# Altium schematic symbol library jlcpcb_2025_04_capacitors_extended_1206.schlib: 2503 symbols (part 7 of 14)
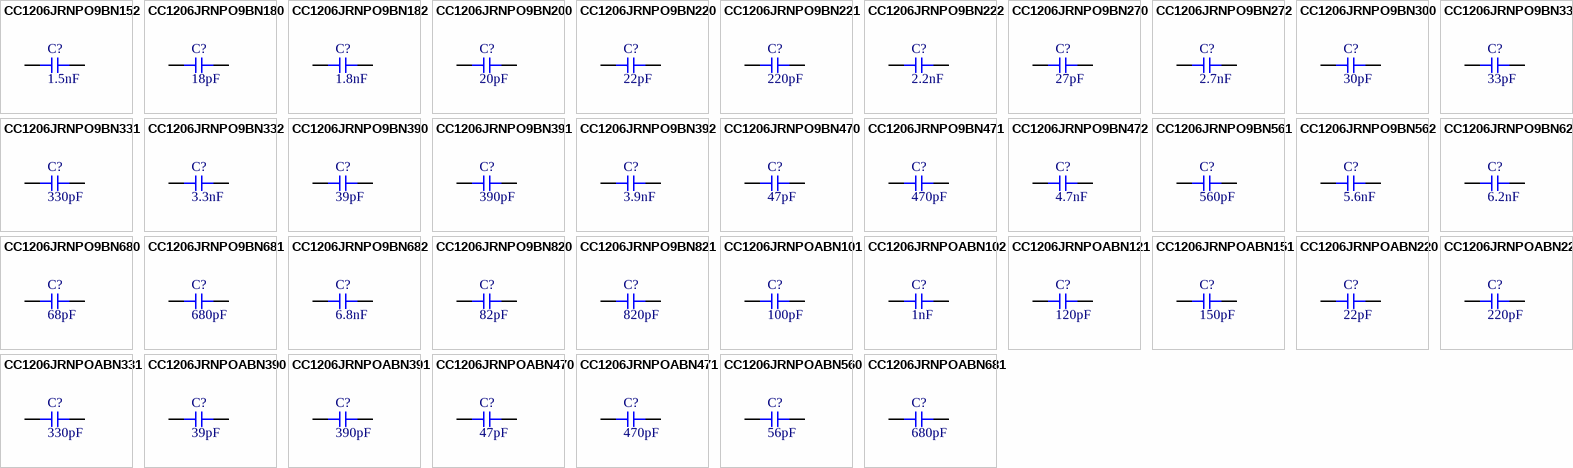
[diagram p68: symbols CC1206JRNPO9BN152 to CC1206JRNPOABN681]

## CC1206JRNPO9BN390
designator C?  Capacitance: 39pF  (hidden comment: *)
Capacitor, Ceramic (MLCC), 39pF, ±5%, 50V, NP0, ±5%, SMD 1206; Manufacturer: YAGEO; Manufacturer Part Number: CC1206JRNPO9BN390; Package Size: 1206; JLCPCB Basic Part: No; JLCPCB Part Number: C577164; Supplier 1: LCSC; Category: Capacitors - MLCC; Supplier Part Number 1: C577164; Tolerance: ±5%; Voltage Rating: 50V; Temperature Coefficient: NP0; RoHS: Yes; ComponentLink1Description: Datasheet; ComponentLink1URL: https://wmsc.lcsc.com/wmsc/upload/file/pdf/v2/lcsc/2009261808_YAGEO-CC1206JRNPO9BN390_C577164.pdf; ComponentLink2Description: JLCPCB Part URL; ComponentLink2URL: https://jlcpcb.com/partdetail/C577164; ComponentLink3Description: LCSC Part URL; ComponentLink3URL: https://lcsc.com/product-detail/Multilayer-Ceramic-Capacitors-MLCC---SMD-SMT_YAGEO-YAGEO-CC1206JRNPO9BN390_C577164.html
footprint CAP-1206 (1206 (3216M) Capacitor)
pins: 1, 2

## CC1206JRNPO9BN391
designator C?  Capacitance: 390pF  (hidden comment: *)
Capacitor, Ceramic (MLCC), 390pF, ±5%, 50V, NP0, ±5%, SMD 1206; Manufacturer: YAGEO; Manufacturer Part Number: CC1206JRNPO9BN391; Package Size: 1206; JLCPCB Basic Part: No; JLCPCB Part Number: C577165; Supplier 1: LCSC; Category: Capacitors - MLCC; Supplier Part Number 1: C577165; Tolerance: ±5%; Voltage Rating: 50V; Temperature Coefficient: NP0; RoHS: Yes; ComponentLink1Description: Datasheet; ComponentLink1URL: https://wmsc.lcsc.com/wmsc/upload/file/pdf/v2/lcsc/2009261808_YAGEO-CC1206JRNPO9BN391_C577165.pdf; ComponentLink2Description: JLCPCB Part URL; ComponentLink2URL: https://jlcpcb.com/partdetail/C577165; ComponentLink3Description: LCSC Part URL; ComponentLink3URL: https://lcsc.com/product-detail/Multilayer-Ceramic-Capacitors-MLCC---SMD-SMT_YAGEO-YAGEO-CC1206JRNPO9BN391_C577165.html
footprint CAP-1206 (1206 (3216M) Capacitor)
pins: 1, 2

## CC1206JRNPO9BN392
designator C?  Capacitance: 3.9nF  (hidden comment: *)
Capacitor, Ceramic (MLCC), 3.9nF, ±5%, 50V, NP0, ±5%, SMD 1206; Manufacturer: YAGEO; Manufacturer Part Number: CC1206JRNPO9BN392; Package Size: 1206; JLCPCB Basic Part: No; JLCPCB Part Number: C541503; Supplier 1: LCSC; Category: Capacitors - MLCC; Supplier Part Number 1: C541503; Tolerance: ±5%; Voltage Rating: 50V; Temperature Coefficient: NP0; RoHS: Yes; ComponentLink1Description: Datasheet; ComponentLink1URL: https://wmsc.lcsc.com/wmsc/upload/file/pdf/v2/lcsc/2006151141_YAGEO-CC1206JRNPO9BN392_C541503.pdf; ComponentLink2Description: JLCPCB Part URL; ComponentLink2URL: https://jlcpcb.com/partdetail/C541503; ComponentLink3Description: LCSC Part URL; ComponentLink3URL: https://lcsc.com/product-detail/Multilayer-Ceramic-Capacitors-MLCC---SMD-SMT_YAGEO-YAGEO-CC1206JRNPO9BN392_C541503.html
footprint CAP-1206 (1206 (3216M) Capacitor)
pins: 1, 2

## CC1206JRNPO9BN470
designator C?  Capacitance: 47pF  (hidden comment: *)
Capacitor, Ceramic (MLCC), 47pF, ±5%, 50V, NP0, ±5%, SMD 1206; Manufacturer: YAGEO; Manufacturer Part Number: CC1206JRNPO9BN470; Package Size: 1206; JLCPCB Basic Part: No; JLCPCB Part Number: C326961; Supplier 1: LCSC; Category: Capacitors - MLCC; Supplier Part Number 1: C326961; Tolerance: ±5%; Voltage Rating: 50V; Temperature Coefficient: NP0; RoHS: Yes; ComponentLink1Description: Datasheet; ComponentLink1URL: https://wmsc.lcsc.com/wmsc/upload/file/pdf/v2/lcsc/1811141241_YAGEO-CC1206JRNPO9BN470_C326961.pdf; ComponentLink2Description: JLCPCB Part URL; ComponentLink2URL: https://jlcpcb.com/partdetail/C326961; ComponentLink3Description: LCSC Part URL; ComponentLink3URL: https://lcsc.com/product-detail/Multilayer-Ceramic-Capacitors-MLCC---SMD-SMT_YAGEO-YAGEO-CC1206JRNPO9BN470_C326961.html
footprint CAP-1206 (1206 (3216M) Capacitor)
pins: 1, 2

## CC1206JRNPO9BN471
designator C?  Capacitance: 470pF  (hidden comment: *)
Capacitor, Ceramic (MLCC), 470pF, ±5%, 50V, NP0, ±5%, SMD 1206; Manufacturer: YAGEO; Manufacturer Part Number: CC1206JRNPO9BN471; Package Size: 1206; JLCPCB Basic Part: No; JLCPCB Part Number: C113885; Supplier 1: LCSC; Category: Capacitors - MLCC; Supplier Part Number 1: C113885; Tolerance: ±5%; Voltage Rating: 50V; Temperature Coefficient: NP0; RoHS: Yes; ComponentLink1Description: Datasheet; ComponentLink1URL: https://wmsc.lcsc.com/wmsc/upload/file/pdf/v2/lcsc/2304140030_YAGEO-CC1206JRNPO9BN471_C113885.pdf; ComponentLink2Description: JLCPCB Part URL; ComponentLink2URL: https://jlcpcb.com/partdetail/C113885; ComponentLink3Description: LCSC Part URL; ComponentLink3URL: https://lcsc.com/product-detail/Multilayer-Ceramic-Capacitors-MLCC---SMD-SMT_YAGEO-YAGEO-CC1206JRNPO9BN471_C113885.html
footprint CAP-1206 (1206 (3216M) Capacitor)
pins: 1, 2

## CC1206JRNPO9BN472
designator C?  Capacitance: 4.7nF  (hidden comment: *)
Capacitor, Ceramic (MLCC), 4.7nF, ±5%, 50V, NP0, ±5%, SMD 1206; Manufacturer: YAGEO; Manufacturer Part Number: CC1206JRNPO9BN472; Package Size: 1206; JLCPCB Basic Part: No; JLCPCB Part Number: C113886; Supplier 1: LCSC; Category: Capacitors - MLCC; Supplier Part Number 1: C113886; Tolerance: ±5%; Voltage Rating: 50V; Temperature Coefficient: NP0; RoHS: Yes; ComponentLink1Description: Datasheet; ComponentLink1URL: https://wmsc.lcsc.com/wmsc/upload/file/pdf/v2/lcsc/2304140030_YAGEO-CC1206JRNPO9BN472_C113886.pdf; ComponentLink2Description: JLCPCB Part URL; ComponentLink2URL: https://jlcpcb.com/partdetail/C113886; ComponentLink3Description: LCSC Part URL; ComponentLink3URL: https://lcsc.com/product-detail/Multilayer-Ceramic-Capacitors-MLCC---SMD-SMT_YAGEO-YAGEO-CC1206JRNPO9BN472_C113886.html
footprint CAP-1206 (1206 (3216M) Capacitor)
pins: 1, 2

## CC1206JRNPO9BN561
designator C?  Capacitance: 560pF  (hidden comment: *)
Capacitor, Ceramic (MLCC), 560pF, ±5%, 50V, NP0, ±5%, SMD 1206; Manufacturer: YAGEO; Manufacturer Part Number: CC1206JRNPO9BN561; Package Size: 1206; JLCPCB Basic Part: No; JLCPCB Part Number: C577166; Supplier 1: LCSC; Category: Capacitors - MLCC; Supplier Part Number 1: C577166; Tolerance: ±5%; Voltage Rating: 50V; Temperature Coefficient: NP0; RoHS: Yes; ComponentLink1Description: Datasheet; ComponentLink1URL: https://wmsc.lcsc.com/wmsc/upload/file/pdf/v2/lcsc/2009261809_YAGEO-CC1206JRNPO9BN561_C577166.pdf; ComponentLink2Description: JLCPCB Part URL; ComponentLink2URL: https://jlcpcb.com/partdetail/C577166; ComponentLink3Description: LCSC Part URL; ComponentLink3URL: https://lcsc.com/product-detail/Multilayer-Ceramic-Capacitors-MLCC---SMD-SMT_YAGEO-YAGEO-CC1206JRNPO9BN561_C577166.html
footprint CAP-1206 (1206 (3216M) Capacitor)
pins: 1, 2

## CC1206JRNPO9BN562
designator C?  Capacitance: 5.6nF  (hidden comment: *)
Capacitor, Ceramic (MLCC), 5.6nF, ±5%, 50V, NP0, ±5%, SMD 1206; Manufacturer: YAGEO; Manufacturer Part Number: CC1206JRNPO9BN562; Package Size: 1206; JLCPCB Basic Part: No; JLCPCB Part Number: C527296; Supplier 1: LCSC; Category: Capacitors - MLCC; Supplier Part Number 1: C527296; Tolerance: ±5%; Voltage Rating: 50V; Temperature Coefficient: NP0; RoHS: Yes; ComponentLink1Description: Datasheet; ComponentLink1URL: https://wmsc.lcsc.com/wmsc/upload/file/pdf/v2/lcsc/2008061533_YAGEO-CC1206JRNPO9BN562_C527296.pdf; ComponentLink2Description: JLCPCB Part URL; ComponentLink2URL: https://jlcpcb.com/partdetail/C527296; ComponentLink3Description: LCSC Part URL; ComponentLink3URL: https://lcsc.com/product-detail/Multilayer-Ceramic-Capacitors-MLCC---SMD-SMT_YAGEO-YAGEO-CC1206JRNPO9BN562_C527296.html
footprint CAP-1206 (1206 (3216M) Capacitor)
pins: 1, 2

## CC1206JRNPO9BN622
designator C?  Capacitance: 6.2nF  (hidden comment: *)
Capacitor, Ceramic (MLCC), 6.2nF, ±5%, null, NP0, ±5%, SMD 1206; Manufacturer: YAGEO; Manufacturer Part Number: CC1206JRNPO9BN622; Package Size: 1206; JLCPCB Basic Part: No; JLCPCB Part Number: C577167; Supplier 1: LCSC; Category: Capacitors - MLCC; Supplier Part Number 1: C577167; Tolerance: ±5%; Voltage Rating: null; Temperature Coefficient: NP0; RoHS: Yes; ComponentLink1Description: Datasheet; ComponentLink1URL: https://wmsc.lcsc.com/wmsc/upload/file/pdf/v2/lcsc/2212291709_YAGEO-CC1206JRNPO9BN622_C577167.pdf; ComponentLink2Description: JLCPCB Part URL; ComponentLink2URL: https://jlcpcb.com/partdetail/C577167; ComponentLink3Description: LCSC Part URL; ComponentLink3URL: https://lcsc.com/product-detail/Multilayer-Ceramic-Capacitors-MLCC---SMD-SMT_YAGEO-YAGEO-CC1206JRNPO9BN622_C577167.html
footprint CAP-1206 (1206 (3216M) Capacitor)
pins: 1, 2

## CC1206JRNPO9BN680
designator C?  Capacitance: 68pF  (hidden comment: *)
Capacitor, Ceramic (MLCC), 68pF, ±5%, 50V, NP0, ±5%, SMD 1206; Manufacturer: YAGEO; Manufacturer Part Number: CC1206JRNPO9BN680; Package Size: 1206; JLCPCB Basic Part: No; JLCPCB Part Number: C327056; Supplier 1: LCSC; Category: Capacitors - MLCC; Supplier Part Number 1: C327056; Tolerance: ±5%; Voltage Rating: 50V; Temperature Coefficient: NP0; RoHS: Yes; ComponentLink1Description: Datasheet; ComponentLink1URL: https://wmsc.lcsc.com/wmsc/upload/file/pdf/v2/lcsc/1811141233_YAGEO-CC1206JRNPO9BN680_C327056.pdf; ComponentLink2Description: JLCPCB Part URL; ComponentLink2URL: https://jlcpcb.com/partdetail/C327056; ComponentLink3Description: LCSC Part URL; ComponentLink3URL: https://lcsc.com/product-detail/Multilayer-Ceramic-Capacitors-MLCC---SMD-SMT_YAGEO-YAGEO-CC1206JRNPO9BN680_C327056.html
footprint CAP-1206 (1206 (3216M) Capacitor)
pins: 1, 2

## CC1206JRNPO9BN681
designator C?  Capacitance: 680pF  (hidden comment: *)
Capacitor, Ceramic (MLCC), 680pF, ±5%, 50V, NP0, ±5%, SMD 1206; Manufacturer: YAGEO; Manufacturer Part Number: CC1206JRNPO9BN681; Package Size: 1206; JLCPCB Basic Part: No; JLCPCB Part Number: C541478; Supplier 1: LCSC; Category: Capacitors - MLCC; Supplier Part Number 1: C541478; Tolerance: ±5%; Voltage Rating: 50V; Temperature Coefficient: NP0; RoHS: Yes; ComponentLink1Description: Datasheet; ComponentLink1URL: https://wmsc.lcsc.com/wmsc/upload/file/pdf/v2/lcsc/2006151139_YAGEO-CC1206JRNPO9BN681_C541478.pdf; ComponentLink2Description: JLCPCB Part URL; ComponentLink2URL: https://jlcpcb.com/partdetail/C541478; ComponentLink3Description: LCSC Part URL; ComponentLink3URL: https://lcsc.com/product-detail/Multilayer-Ceramic-Capacitors-MLCC---SMD-SMT_YAGEO-YAGEO-CC1206JRNPO9BN681_C541478.html
footprint CAP-1206 (1206 (3216M) Capacitor)
pins: 1, 2

## CC1206JRNPO9BN682
designator C?  Capacitance: 6.8nF  (hidden comment: *)
Capacitor, Ceramic (MLCC), 6.8nF, ±5%, 50V, NP0, ±5%, SMD 1206; Manufacturer: YAGEO; Manufacturer Part Number: CC1206JRNPO9BN682; Package Size: 1206; JLCPCB Basic Part: No; JLCPCB Part Number: C326672; Supplier 1: LCSC; Category: Capacitors - MLCC; Supplier Part Number 1: C326672; Tolerance: ±5%; Voltage Rating: 50V; Temperature Coefficient: NP0; RoHS: Yes; ComponentLink1Description: Datasheet; ComponentLink1URL: https://wmsc.lcsc.com/wmsc/upload/file/pdf/v2/lcsc/1811151646_YAGEO-CC1206JRNPO9BN682_C326672.pdf; ComponentLink2Description: JLCPCB Part URL; ComponentLink2URL: https://jlcpcb.com/partdetail/C326672; ComponentLink3Description: LCSC Part URL; ComponentLink3URL: https://lcsc.com/product-detail/Multilayer-Ceramic-Capacitors-MLCC---SMD-SMT_YAGEO-YAGEO-CC1206JRNPO9BN682_C326672.html
footprint CAP-1206 (1206 (3216M) Capacitor)
pins: 1, 2

## CC1206JRNPO9BN820
designator C?  Capacitance: 82pF  (hidden comment: *)
Capacitor, Ceramic (MLCC), 82pF, ±5%, null, NP0, ±5%, SMD 1206; Manufacturer: YAGEO; Manufacturer Part Number: CC1206JRNPO9BN820; Package Size: 1206; JLCPCB Basic Part: No; JLCPCB Part Number: C577169; Supplier 1: LCSC; Category: Capacitors - MLCC; Supplier Part Number 1: C577169; Tolerance: ±5%; Voltage Rating: null; Temperature Coefficient: NP0; RoHS: Yes; ComponentLink1Description: Datasheet; ComponentLink1URL: https://wmsc.lcsc.com/wmsc/upload/file/pdf/v2/lcsc/2211211800_YAGEO-CC1206JRNPO9BN820_C577169.pdf; ComponentLink2Description: JLCPCB Part URL; ComponentLink2URL: https://jlcpcb.com/partdetail/C577169; ComponentLink3Description: LCSC Part URL; ComponentLink3URL: https://lcsc.com/product-detail/Multilayer-Ceramic-Capacitors-MLCC---SMD-SMT_YAGEO-YAGEO-CC1206JRNPO9BN820_C577169.html
footprint CAP-1206 (1206 (3216M) Capacitor)
pins: 1, 2

## CC1206JRNPO9BN821
designator C?  Capacitance: 820pF  (hidden comment: *)
Capacitor, Ceramic (MLCC), 820pF, ±5%, 50V, NP0, ±5%, SMD 1206; Manufacturer: YAGEO; Manufacturer Part Number: CC1206JRNPO9BN821; Package Size: 1206; JLCPCB Basic Part: No; JLCPCB Part Number: C577170; Supplier 1: LCSC; Category: Capacitors - MLCC; Supplier Part Number 1: C577170; Tolerance: ±5%; Voltage Rating: 50V; Temperature Coefficient: NP0; RoHS: Yes; ComponentLink1Description: Datasheet; ComponentLink1URL: https://wmsc.lcsc.com/wmsc/upload/file/pdf/v2/lcsc/2009261809_YAGEO-CC1206JRNPO9BN821_C577170.pdf; ComponentLink2Description: JLCPCB Part URL; ComponentLink2URL: https://jlcpcb.com/partdetail/C577170; ComponentLink3Description: LCSC Part URL; ComponentLink3URL: https://lcsc.com/product-detail/Multilayer-Ceramic-Capacitors-MLCC---SMD-SMT_YAGEO-YAGEO-CC1206JRNPO9BN821_C577170.html
footprint CAP-1206 (1206 (3216M) Capacitor)
pins: 1, 2

## CC1206JRNPOABN101
designator C?  Capacitance: 100pF  (hidden comment: *)
Capacitor, Ceramic (MLCC), 100pF, ±5%, 200V, NP0, ±5%, SMD 1206; Manufacturer: YAGEO; Manufacturer Part Number: CC1206JRNPOABN101; Package Size: 1206; JLCPCB Basic Part: No; JLCPCB Part Number: C577171; Supplier 1: LCSC; Category: Capacitors - MLCC; Supplier Part Number 1: C577171; Tolerance: ±5%; Voltage Rating: 200V; Temperature Coefficient: NP0; RoHS: Yes; ComponentLink1Description: Datasheet; ComponentLink1URL: https://wmsc.lcsc.com/wmsc/upload/file/pdf/v2/lcsc/2204121100_YAGEO-CC1206JRNPOABN101_C577171.pdf; ComponentLink2Description: JLCPCB Part URL; ComponentLink2URL: https://jlcpcb.com/partdetail/C577171; ComponentLink3Description: LCSC Part URL; ComponentLink3URL: https://lcsc.com/product-detail/Multilayer-Ceramic-Capacitors-MLCC---SMD-SMT_YAGEO-YAGEO-CC1206JRNPOABN101_C577171.html
footprint CAP-1206 (1206 (3216M) Capacitor)
pins: 1, 2

## CC1206JRNPOABN102
designator C?  Capacitance: 1nF  (hidden comment: *)
Capacitor, Ceramic (MLCC), 1nF, ±5%, 200V, NP0, ±5%, SMD 1206; Manufacturer: YAGEO; Manufacturer Part Number: CC1206JRNPOABN102; Package Size: 1206; JLCPCB Basic Part: No; JLCPCB Part Number: C326762; Supplier 1: LCSC; Category: Capacitors - MLCC; Supplier Part Number 1: C326762; Tolerance: ±5%; Voltage Rating: 200V; Temperature Coefficient: NP0; RoHS: Yes; ComponentLink1Description: Datasheet; ComponentLink1URL: https://wmsc.lcsc.com/wmsc/upload/file/pdf/v2/lcsc/2311211121_YAGEO-CC1206JRNPOABN102_C326762.pdf; ComponentLink2Description: JLCPCB Part URL; ComponentLink2URL: https://jlcpcb.com/partdetail/C326762; ComponentLink3Description: LCSC Part URL; ComponentLink3URL: https://lcsc.com/product-detail/Multilayer-Ceramic-Capacitors-MLCC---SMD-SMT_YAGEO-YAGEO-CC1206JRNPOABN102_C326762.html
footprint CAP-1206 (1206 (3216M) Capacitor)
pins: 1, 2

## CC1206JRNPOABN121
designator C?  Capacitance: 120pF  (hidden comment: *)
Capacitor, Ceramic (MLCC), 120pF, ±5%, 200V, NP0, ±5%, SMD 1206; Manufacturer: YAGEO; Manufacturer Part Number: CC1206JRNPOABN121; Package Size: 1206; JLCPCB Basic Part: No; JLCPCB Part Number: C113887; Supplier 1: LCSC; Category: Capacitors - MLCC; Supplier Part Number 1: C113887; Tolerance: ±5%; Voltage Rating: 200V; Temperature Coefficient: NP0; RoHS: Yes; ComponentLink1Description: Datasheet; ComponentLink1URL: https://wmsc.lcsc.com/wmsc/upload/file/pdf/v2/lcsc/2304140030_YAGEO-CC1206JRNPOABN121_C113887.pdf; ComponentLink2Description: JLCPCB Part URL; ComponentLink2URL: https://jlcpcb.com/partdetail/C113887; ComponentLink3Description: LCSC Part URL; ComponentLink3URL: https://lcsc.com/product-detail/Multilayer-Ceramic-Capacitors-MLCC---SMD-SMT_YAGEO-YAGEO-CC1206JRNPOABN121_C113887.html
footprint CAP-1206 (1206 (3216M) Capacitor)
pins: 1, 2

## CC1206JRNPOABN151
designator C?  Capacitance: 150pF  (hidden comment: *)
Capacitor, Ceramic (MLCC), 150pF, ±5%, 200V, NP0, ±5%, SMD 1206; Manufacturer: YAGEO; Manufacturer Part Number: CC1206JRNPOABN151; Package Size: 1206; JLCPCB Basic Part: No; JLCPCB Part Number: C326651; Supplier 1: LCSC; Category: Capacitors - MLCC; Supplier Part Number 1: C326651; Tolerance: ±5%; Voltage Rating: 200V; Temperature Coefficient: NP0; RoHS: Yes; ComponentLink1Description: Datasheet; ComponentLink1URL: https://wmsc.lcsc.com/wmsc/upload/file/pdf/v2/lcsc/1811141232_YAGEO-CC1206JRNPOABN151_C326651.pdf; ComponentLink2Description: JLCPCB Part URL; ComponentLink2URL: https://jlcpcb.com/partdetail/C326651; ComponentLink3Description: LCSC Part URL; ComponentLink3URL: https://lcsc.com/product-detail/Multilayer-Ceramic-Capacitors-MLCC---SMD-SMT_YAGEO-YAGEO-CC1206JRNPOABN151_C326651.html
footprint CAP-1206 (1206 (3216M) Capacitor)
pins: 1, 2

## CC1206JRNPOABN220
designator C?  Capacitance: 22pF  (hidden comment: *)
Capacitor, Ceramic (MLCC), 22pF, ±5%, 200V, NP0, ±5%, SMD 1206; Manufacturer: YAGEO; Manufacturer Part Number: CC1206JRNPOABN220; Package Size: 1206; JLCPCB Basic Part: No; JLCPCB Part Number: C527297; Supplier 1: LCSC; Category: Capacitors - MLCC; Supplier Part Number 1: C527297; Tolerance: ±5%; Voltage Rating: 200V; Temperature Coefficient: NP0; RoHS: Yes; ComponentLink1Description: Datasheet; ComponentLink1URL: https://wmsc.lcsc.com/wmsc/upload/file/pdf/v2/lcsc/2006181535_YAGEO-CC1206JRNPOABN220_C527297.pdf; ComponentLink2Description: JLCPCB Part URL; ComponentLink2URL: https://jlcpcb.com/partdetail/C527297; ComponentLink3Description: LCSC Part URL; ComponentLink3URL: https://lcsc.com/product-detail/Multilayer-Ceramic-Capacitors-MLCC---SMD-SMT_YAGEO-YAGEO-CC1206JRNPOABN220_C527297.html
footprint CAP-1206 (1206 (3216M) Capacitor)
pins: 1, 2

## CC1206JRNPOABN221
designator C?  Capacitance: 220pF  (hidden comment: *)
Capacitor, Ceramic (MLCC), 220pF, ±5%, 200V, NP0, ±5%, SMD 1206; Manufacturer: YAGEO; Manufacturer Part Number: CC1206JRNPOABN221; Package Size: 1206; JLCPCB Basic Part: No; JLCPCB Part Number: C527298; Supplier 1: LCSC; Category: Capacitors - MLCC; Supplier Part Number 1: C527298; Tolerance: ±5%; Voltage Rating: 200V; Temperature Coefficient: NP0; RoHS: Yes; ComponentLink1Description: Datasheet; ComponentLink1URL: https://wmsc.lcsc.com/wmsc/upload/file/pdf/v2/lcsc/2007221234_YAGEO-CC1206JRNPOABN221_C527298.pdf; ComponentLink2Description: JLCPCB Part URL; ComponentLink2URL: https://jlcpcb.com/partdetail/C527298; ComponentLink3Description: LCSC Part URL; ComponentLink3URL: https://lcsc.com/product-detail/Multilayer-Ceramic-Capacitors-MLCC---SMD-SMT_YAGEO-YAGEO-CC1206JRNPOABN221_C527298.html
footprint CAP-1206 (1206 (3216M) Capacitor)
pins: 1, 2

## CC1206JRNPOABN331
designator C?  Capacitance: 330pF  (hidden comment: *)
Capacitor, Ceramic (MLCC), 330pF, ±5%, 200V, NP0, ±5%, SMD 1206; Manufacturer: YAGEO; Manufacturer Part Number: CC1206JRNPOABN331; Package Size: 1206; JLCPCB Basic Part: No; JLCPCB Part Number: C527299; Supplier 1: LCSC; Category: Capacitors - MLCC; Supplier Part Number 1: C527299; Tolerance: ±5%; Voltage Rating: 200V; Temperature Coefficient: NP0; RoHS: Yes; ComponentLink1Description: Datasheet; ComponentLink1URL: https://wmsc.lcsc.com/wmsc/upload/file/pdf/v2/lcsc/2006031836_YAGEO-CC1206JRNPOABN331_C527299.pdf; ComponentLink2Description: JLCPCB Part URL; ComponentLink2URL: https://jlcpcb.com/partdetail/C527299; ComponentLink3Description: LCSC Part URL; ComponentLink3URL: https://lcsc.com/product-detail/Multilayer-Ceramic-Capacitors-MLCC---SMD-SMT_YAGEO-YAGEO-CC1206JRNPOABN331_C527299.html
footprint CAP-1206 (1206 (3216M) Capacitor)
pins: 1, 2

## CC1206JRNPOABN390
designator C?  Capacitance: 39pF  (hidden comment: *)
Capacitor, Ceramic (MLCC), 39pF, ±5%, 200V, NP0, ±5%, SMD 1206; Manufacturer: YAGEO; Manufacturer Part Number: CC1206JRNPOABN390; Package Size: 1206; JLCPCB Basic Part: No; JLCPCB Part Number: C577176; Supplier 1: LCSC; Category: Capacitors - MLCC; Supplier Part Number 1: C577176; Tolerance: ±5%; Voltage Rating: 200V; Temperature Coefficient: NP0; RoHS: Yes; ComponentLink1Description: Datasheet; ComponentLink1URL: https://wmsc.lcsc.com/wmsc/upload/file/pdf/v2/lcsc/2311211121_YAGEO-CC1206JRNPOABN390_C577176.pdf; ComponentLink2Description: JLCPCB Part URL; ComponentLink2URL: https://jlcpcb.com/partdetail/C577176; ComponentLink3Description: LCSC Part URL; ComponentLink3URL: https://lcsc.com/product-detail/Multilayer-Ceramic-Capacitors-MLCC---SMD-SMT_YAGEO-YAGEO-CC1206JRNPOABN390_C577176.html
footprint CAP-1206 (1206 (3216M) Capacitor)
pins: 1, 2

## CC1206JRNPOABN391
designator C?  Capacitance: 390pF  (hidden comment: *)
Capacitor, Ceramic (MLCC), 390pF, ±5%, 200V, NP0, ±5%, SMD 1206; Manufacturer: YAGEO; Manufacturer Part Number: CC1206JRNPOABN391; Package Size: 1206; JLCPCB Basic Part: No; JLCPCB Part Number: C527300; Supplier 1: LCSC; Category: Capacitors - MLCC; Supplier Part Number 1: C527300; Tolerance: ±5%; Voltage Rating: 200V; Temperature Coefficient: NP0; RoHS: Yes; ComponentLink1Description: Datasheet; ComponentLink1URL: https://wmsc.lcsc.com/wmsc/upload/file/pdf/v2/lcsc/2007021837_YAGEO-CC1206JRNPOABN391_C527300.pdf; ComponentLink2Description: JLCPCB Part URL; ComponentLink2URL: https://jlcpcb.com/partdetail/C527300; ComponentLink3Description: LCSC Part URL; ComponentLink3URL: https://lcsc.com/product-detail/Multilayer-Ceramic-Capacitors-MLCC---SMD-SMT_YAGEO-YAGEO-CC1206JRNPOABN391_C527300.html
footprint CAP-1206 (1206 (3216M) Capacitor)
pins: 1, 2

## CC1206JRNPOABN470
designator C?  Capacitance: 47pF  (hidden comment: *)
Capacitor, Ceramic (MLCC), 47pF, ±5%, 200V, NP0, ±5%, SMD 1206; Manufacturer: YAGEO; Manufacturer Part Number: CC1206JRNPOABN470; Package Size: 1206; JLCPCB Basic Part: No; JLCPCB Part Number: C527301; Supplier 1: LCSC; Category: Capacitors - MLCC; Supplier Part Number 1: C527301; Tolerance: ±5%; Voltage Rating: 200V; Temperature Coefficient: NP0; RoHS: Yes; ComponentLink1Description: Datasheet; ComponentLink1URL: https://wmsc.lcsc.com/wmsc/upload/file/pdf/v2/lcsc/2006101835_YAGEO-CC1206JRNPOABN470_C527301.pdf; ComponentLink2Description: JLCPCB Part URL; ComponentLink2URL: https://jlcpcb.com/partdetail/C527301; ComponentLink3Description: LCSC Part URL; ComponentLink3URL: https://lcsc.com/product-detail/Multilayer-Ceramic-Capacitors-MLCC---SMD-SMT_YAGEO-YAGEO-CC1206JRNPOABN470_C527301.html
footprint CAP-1206 (1206 (3216M) Capacitor)
pins: 1, 2

## CC1206JRNPOABN471
designator C?  Capacitance: 470pF  (hidden comment: *)
Capacitor, Ceramic (MLCC), 470pF, ±5%, 200V, NP0, ±5%, SMD 1206; Manufacturer: YAGEO; Manufacturer Part Number: CC1206JRNPOABN471; Package Size: 1206; JLCPCB Basic Part: No; JLCPCB Part Number: C527302; Supplier 1: LCSC; Category: Capacitors - MLCC; Supplier Part Number 1: C527302; Tolerance: ±5%; Voltage Rating: 200V; Temperature Coefficient: NP0; RoHS: Yes; ComponentLink1Description: Datasheet; ComponentLink1URL: https://wmsc.lcsc.com/wmsc/upload/file/pdf/v2/lcsc/2006101835_YAGEO-CC1206JRNPOABN471_C527302.pdf; ComponentLink2Description: JLCPCB Part URL; ComponentLink2URL: https://jlcpcb.com/partdetail/C527302; ComponentLink3Description: LCSC Part URL; ComponentLink3URL: https://lcsc.com/product-detail/Multilayer-Ceramic-Capacitors-MLCC---SMD-SMT_YAGEO-YAGEO-CC1206JRNPOABN471_C527302.html
footprint CAP-1206 (1206 (3216M) Capacitor)
pins: 1, 2

## CC1206JRNPOABN560
designator C?  Capacitance: 56pF  (hidden comment: *)
Capacitor, Ceramic (MLCC), 56pF, ±5%, 200V, NP0, ±5%, SMD 1206; Manufacturer: YAGEO; Manufacturer Part Number: CC1206JRNPOABN560; Package Size: 1206; JLCPCB Basic Part: No; JLCPCB Part Number: C527303; Supplier 1: LCSC; Category: Capacitors - MLCC; Supplier Part Number 1: C527303; Tolerance: ±5%; Voltage Rating: 200V; Temperature Coefficient: NP0; RoHS: Yes; ComponentLink1Description: Datasheet; ComponentLink1URL: https://wmsc.lcsc.com/wmsc/upload/file/pdf/v2/lcsc/2007171236_YAGEO-CC1206JRNPOABN560_C527303.pdf; ComponentLink2Description: JLCPCB Part URL; ComponentLink2URL: https://jlcpcb.com/partdetail/C527303; ComponentLink3Description: LCSC Part URL; ComponentLink3URL: https://lcsc.com/product-detail/Multilayer-Ceramic-Capacitors-MLCC---SMD-SMT_YAGEO-YAGEO-CC1206JRNPOABN560_C527303.html
footprint CAP-1206 (1206 (3216M) Capacitor)
pins: 1, 2

## CC1206JRNPOABN681
designator C?  Capacitance: 680pF  (hidden comment: *)
Capacitor, Ceramic (MLCC), 680pF, ±5%, 200V, NP0, ±5%, SMD 1206; Manufacturer: YAGEO; Manufacturer Part Number: CC1206JRNPOABN681; Package Size: 1206; JLCPCB Basic Part: No; JLCPCB Part Number: C527304; Supplier 1: LCSC; Category: Capacitors - MLCC; Supplier Part Number 1: C527304; Tolerance: ±5%; Voltage Rating: 200V; Temperature Coefficient: NP0; RoHS: Yes; ComponentLink1Description: Datasheet; ComponentLink1URL: https://wmsc.lcsc.com/wmsc/upload/file/pdf/v2/lcsc/2006101835_YAGEO-CC1206JRNPOABN681_C527304.pdf; ComponentLink2Description: JLCPCB Part URL; ComponentLink2URL: https://jlcpcb.com/partdetail/C527304; ComponentLink3Description: LCSC Part URL; ComponentLink3URL: https://lcsc.com/product-detail/Multilayer-Ceramic-Capacitors-MLCC---SMD-SMT_YAGEO-YAGEO-CC1206JRNPOABN681_C527304.html
footprint CAP-1206 (1206 (3216M) Capacitor)
pins: 1, 2

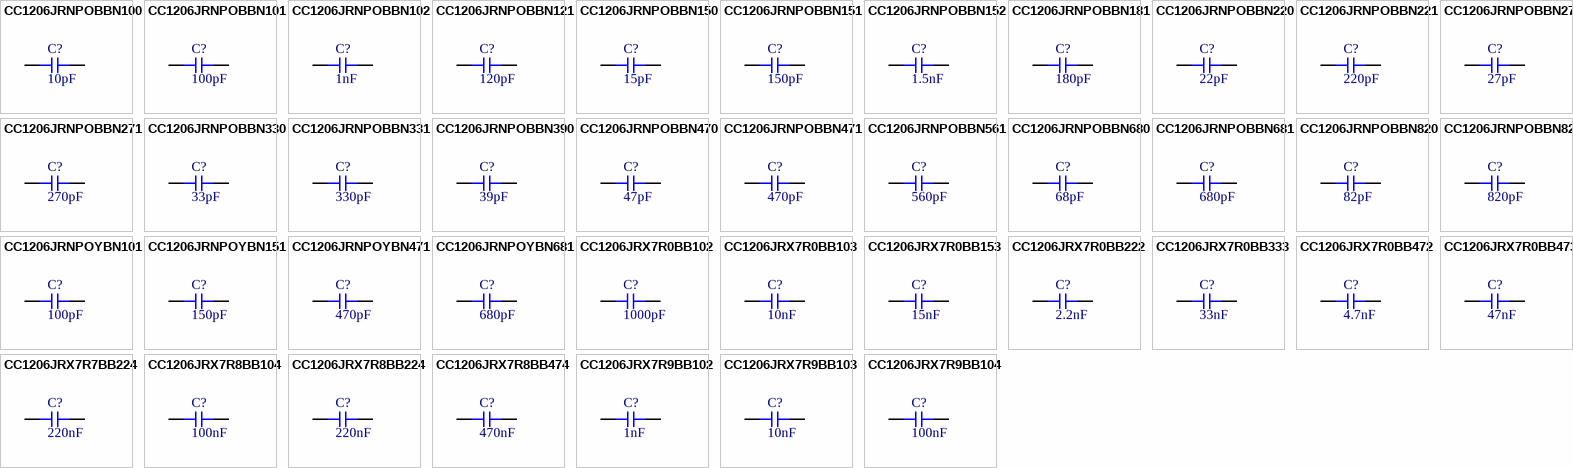
[diagram p28: symbols CC1206JRNPOBBN100 to CC1206JRX7R9BB104]

## CC1206JRNPOBBN100
designator C?  Capacitance: 10pF  (hidden comment: *)
Capacitor, Ceramic (MLCC), 10pF, ±5%, 500V, NP0, ±5%, SMD 1206; Manufacturer: YAGEO; Manufacturer Part Number: CC1206JRNPOBBN100; Package Size: 1206; JLCPCB Basic Part: No; JLCPCB Part Number: C469628; Supplier 1: LCSC; Category: Capacitors - MLCC; Supplier Part Number 1: C469628; Tolerance: ±5%; Voltage Rating: 500V; Temperature Coefficient: NP0; RoHS: Yes; ComponentLink1Description: Datasheet; ComponentLink1URL: https://wmsc.lcsc.com/wmsc/upload/file/pdf/v2/lcsc/2311211121_YAGEO-CC1206JRNPOBBN100_C469628.pdf; ComponentLink2Description: JLCPCB Part URL; ComponentLink2URL: https://jlcpcb.com/partdetail/C469628; ComponentLink3Description: LCSC Part URL; ComponentLink3URL: https://lcsc.com/product-detail/Multilayer-Ceramic-Capacitors-MLCC---SMD-SMT_YAGEO-YAGEO-CC1206JRNPOBBN100_C469628.html
footprint CAP-1206 (1206 (3216M) Capacitor)
pins: 1, 2

## CC1206JRNPOBBN101
designator C?  Capacitance: 100pF  (hidden comment: *)
Capacitor, Ceramic (MLCC), 100pF, ±5%, 500V, NP0, ±5%, SMD 1206; Manufacturer: YAGEO; Manufacturer Part Number: CC1206JRNPOBBN101; Package Size: 1206; JLCPCB Basic Part: No; JLCPCB Part Number: C113888; Supplier 1: LCSC; Category: Capacitors - MLCC; Supplier Part Number 1: C113888; Tolerance: ±5%; Voltage Rating: 500V; Temperature Coefficient: NP0; RoHS: Yes; ComponentLink1Description: Datasheet; ComponentLink1URL: https://wmsc.lcsc.com/wmsc/upload/file/pdf/v2/lcsc/2304140030_YAGEO-CC1206JRNPOBBN101_C113888.pdf; ComponentLink2Description: JLCPCB Part URL; ComponentLink2URL: https://jlcpcb.com/partdetail/C113888; ComponentLink3Description: LCSC Part URL; ComponentLink3URL: https://lcsc.com/product-detail/Multilayer-Ceramic-Capacitors-MLCC---SMD-SMT_YAGEO-YAGEO-CC1206JRNPOBBN101_C113888.html
footprint CAP-1206 (1206 (3216M) Capacitor)
pins: 1, 2

## CC1206JRNPOBBN102
designator C?  Capacitance: 1nF  (hidden comment: *)
Capacitor, Ceramic (MLCC), 1nF, ±5%, 500V, NP0, ±5%, SMD 1206; Manufacturer: YAGEO; Manufacturer Part Number: CC1206JRNPOBBN102; Package Size: 1206; JLCPCB Basic Part: No; JLCPCB Part Number: C577179; Supplier 1: LCSC; Category: Capacitors - MLCC; Supplier Part Number 1: C577179; Tolerance: ±5%; Voltage Rating: 500V; Temperature Coefficient: NP0; RoHS: Yes; ComponentLink1Description: Datasheet; ComponentLink1URL: https://wmsc.lcsc.com/wmsc/upload/file/pdf/v2/lcsc/2209231730_YAGEO-CC1206JRNPOBBN102_C577179.pdf; ComponentLink2Description: JLCPCB Part URL; ComponentLink2URL: https://jlcpcb.com/partdetail/C577179; ComponentLink3Description: LCSC Part URL; ComponentLink3URL: https://lcsc.com/product-detail/Multilayer-Ceramic-Capacitors-MLCC---SMD-SMT_YAGEO-YAGEO-CC1206JRNPOBBN102_C577179.html
footprint CAP-1206 (1206 (3216M) Capacitor)
pins: 1, 2

## CC1206JRNPOBBN121
designator C?  Capacitance: 120pF  (hidden comment: *)
Capacitor, Ceramic (MLCC), 120pF, ±5%, 500V, NP0, ±5%, SMD 1206; Manufacturer: YAGEO; Manufacturer Part Number: CC1206JRNPOBBN121; Package Size: 1206; JLCPCB Basic Part: No; JLCPCB Part Number: C113889; Supplier 1: LCSC; Category: Capacitors - MLCC; Supplier Part Number 1: C113889; Tolerance: ±5%; Voltage Rating: 500V; Temperature Coefficient: NP0; RoHS: Yes; ComponentLink1Description: Datasheet; ComponentLink1URL: https://wmsc.lcsc.com/wmsc/upload/file/pdf/v2/lcsc/2304140030_YAGEO-CC1206JRNPOBBN121_C113889.pdf; ComponentLink2Description: JLCPCB Part URL; ComponentLink2URL: https://jlcpcb.com/partdetail/C113889; ComponentLink3Description: LCSC Part URL; ComponentLink3URL: https://lcsc.com/product-detail/Multilayer-Ceramic-Capacitors-MLCC---SMD-SMT_YAGEO-YAGEO-CC1206JRNPOBBN121_C113889.html
footprint CAP-1206 (1206 (3216M) Capacitor)
pins: 1, 2

## CC1206JRNPOBBN150
designator C?  Capacitance: 15pF  (hidden comment: *)
Capacitor, Ceramic (MLCC), 15pF, ±5%, 500V, NP0, ±5%, SMD 1206; Manufacturer: YAGEO; Manufacturer Part Number: CC1206JRNPOBBN150; Package Size: 1206; JLCPCB Basic Part: No; JLCPCB Part Number: C577181; Supplier 1: LCSC; Category: Capacitors - MLCC; Supplier Part Number 1: C577181; Tolerance: ±5%; Voltage Rating: 500V; Temperature Coefficient: NP0; RoHS: Yes; ComponentLink1Description: Datasheet; ComponentLink1URL: https://wmsc.lcsc.com/wmsc/upload/file/pdf/v2/lcsc/2304140030_YAGEO-CC1206JRNPOBBN150_C577181.pdf; ComponentLink2Description: JLCPCB Part URL; ComponentLink2URL: https://jlcpcb.com/partdetail/C577181; ComponentLink3Description: LCSC Part URL; ComponentLink3URL: https://lcsc.com/product-detail/Multilayer-Ceramic-Capacitors-MLCC---SMD-SMT_YAGEO-YAGEO-CC1206JRNPOBBN150_C577181.html
footprint CAP-1206 (1206 (3216M) Capacitor)
pins: 1, 2

## CC1206JRNPOBBN151
designator C?  Capacitance: 150pF  (hidden comment: *)
Capacitor, Ceramic (MLCC), 150pF, ±5%, 500V, NP0, ±5%, SMD 1206; Manufacturer: YAGEO; Manufacturer Part Number: CC1206JRNPOBBN151; Package Size: 1206; JLCPCB Basic Part: No; JLCPCB Part Number: C577182; Supplier 1: LCSC; Category: Capacitors - MLCC; Supplier Part Number 1: C577182; Tolerance: ±5%; Voltage Rating: 500V; Temperature Coefficient: NP0; RoHS: Yes; ComponentLink1Description: Datasheet; ComponentLink1URL: https://wmsc.lcsc.com/wmsc/upload/file/pdf/v2/lcsc/2203101903_YAGEO-CC1206JRNPOBBN151_C577182.pdf; ComponentLink2Description: JLCPCB Part URL; ComponentLink2URL: https://jlcpcb.com/partdetail/C577182; ComponentLink3Description: LCSC Part URL; ComponentLink3URL: https://lcsc.com/product-detail/Multilayer-Ceramic-Capacitors-MLCC---SMD-SMT_YAGEO-YAGEO-CC1206JRNPOBBN151_C577182.html
footprint CAP-1206 (1206 (3216M) Capacitor)
pins: 1, 2

## CC1206JRNPOBBN152
designator C?  Capacitance: 1.5nF  (hidden comment: *)
Capacitor, Ceramic (MLCC), 1.5nF, ±5%, 500V, NP0, ±5%, SMD 1206; Manufacturer: YAGEO; Manufacturer Part Number: CC1206JRNPOBBN152; Package Size: 1206; JLCPCB Basic Part: No; JLCPCB Part Number: C326591; Supplier 1: LCSC; Category: Capacitors - MLCC; Supplier Part Number 1: C326591; Tolerance: ±5%; Voltage Rating: 500V; Temperature Coefficient: NP0; RoHS: Yes; ComponentLink1Description: Datasheet; ComponentLink1URL: https://wmsc.lcsc.com/wmsc/upload/file/pdf/v2/lcsc/1811061214_YAGEO-CC1206JRNPOBBN152_C326591.pdf; ComponentLink2Description: JLCPCB Part URL; ComponentLink2URL: https://jlcpcb.com/partdetail/C326591; ComponentLink3Description: LCSC Part URL; ComponentLink3URL: https://lcsc.com/product-detail/Multilayer-Ceramic-Capacitors-MLCC---SMD-SMT_YAGEO-YAGEO-CC1206JRNPOBBN152_C326591.html
footprint CAP-1206 (1206 (3216M) Capacitor)
pins: 1, 2

## CC1206JRNPOBBN181
designator C?  Capacitance: 180pF  (hidden comment: *)
Capacitor, Ceramic (MLCC), 180pF, ±5%, 500V, NP0, ±5%, SMD 1206; Manufacturer: YAGEO; Manufacturer Part Number: CC1206JRNPOBBN181; Package Size: 1206; JLCPCB Basic Part: No; JLCPCB Part Number: C527305; Supplier 1: LCSC; Category: Capacitors - MLCC; Supplier Part Number 1: C527305; Tolerance: ±5%; Voltage Rating: 500V; Temperature Coefficient: NP0; RoHS: Yes; ComponentLink1Description: Datasheet; ComponentLink1URL: https://wmsc.lcsc.com/wmsc/upload/file/pdf/v2/lcsc/2005261833_YAGEO-CC1206JRNPOBBN181_C527305.pdf; ComponentLink2Description: JLCPCB Part URL; ComponentLink2URL: https://jlcpcb.com/partdetail/C527305; ComponentLink3Description: LCSC Part URL; ComponentLink3URL: https://lcsc.com/product-detail/Multilayer-Ceramic-Capacitors-MLCC---SMD-SMT_YAGEO-YAGEO-CC1206JRNPOBBN181_C527305.html
footprint CAP-1206 (1206 (3216M) Capacitor)
pins: 1, 2

## CC1206JRNPOBBN220
designator C?  Capacitance: 22pF  (hidden comment: *)
Capacitor, Ceramic (MLCC), 22pF, ±5%, 500V, NP0, ±5%, SMD 1206; Manufacturer: YAGEO; Manufacturer Part Number: CC1206JRNPOBBN220; Package Size: 1206; JLCPCB Basic Part: No; JLCPCB Part Number: C527306; Supplier 1: LCSC; Category: Capacitors - MLCC; Supplier Part Number 1: C527306; Tolerance: ±5%; Voltage Rating: 500V; Temperature Coefficient: NP0; RoHS: Yes; ComponentLink1Description: Datasheet; ComponentLink1URL: https://wmsc.lcsc.com/wmsc/upload/file/pdf/v2/lcsc/2006241834_YAGEO-CC1206JRNPOBBN220_C527306.pdf; ComponentLink2Description: JLCPCB Part URL; ComponentLink2URL: https://jlcpcb.com/partdetail/C527306; ComponentLink3Description: LCSC Part URL; ComponentLink3URL: https://lcsc.com/product-detail/Multilayer-Ceramic-Capacitors-MLCC---SMD-SMT_YAGEO-YAGEO-CC1206JRNPOBBN220_C527306.html
footprint CAP-1206 (1206 (3216M) Capacitor)
pins: 1, 2

## CC1206JRNPOBBN221
designator C?  Capacitance: 220pF  (hidden comment: *)
Capacitor, Ceramic (MLCC), 220pF, ±5%, 500V, NP0, ±5%, SMD 1206; Manufacturer: YAGEO; Manufacturer Part Number: CC1206JRNPOBBN221; Package Size: 1206; JLCPCB Basic Part: No; JLCPCB Part Number: C527307; Supplier 1: LCSC; Category: Capacitors - MLCC; Supplier Part Number 1: C527307; Tolerance: ±5%; Voltage Rating: 500V; Temperature Coefficient: NP0; RoHS: Yes; ComponentLink1Description: Datasheet; ComponentLink1URL: https://wmsc.lcsc.com/wmsc/upload/file/pdf/v2/lcsc/2005141733_YAGEO-CC1206JRNPOBBN221_C527307.pdf; ComponentLink2Description: JLCPCB Part URL; ComponentLink2URL: https://jlcpcb.com/partdetail/C527307; ComponentLink3Description: LCSC Part URL; ComponentLink3URL: https://lcsc.com/product-detail/Multilayer-Ceramic-Capacitors-MLCC---SMD-SMT_YAGEO-YAGEO-CC1206JRNPOBBN221_C527307.html
footprint CAP-1206 (1206 (3216M) Capacitor)
pins: 1, 2

## CC1206JRNPOBBN270
designator C?  Capacitance: 27pF  (hidden comment: *)
Capacitor, Ceramic (MLCC), 27pF, ±5%, 500V, NP0, ±5%, SMD 1206; Manufacturer: YAGEO; Manufacturer Part Number: CC1206JRNPOBBN270; Package Size: 1206; JLCPCB Basic Part: No; JLCPCB Part Number: C326944; Supplier 1: LCSC; Category: Capacitors - MLCC; Supplier Part Number 1: C326944; Tolerance: ±5%; Voltage Rating: 500V; Temperature Coefficient: NP0; RoHS: Yes; ComponentLink1Description: Datasheet; ComponentLink1URL: https://wmsc.lcsc.com/wmsc/upload/file/pdf/v2/lcsc/2311211121_YAGEO-CC1206JRNPOBBN270_C326944.pdf; ComponentLink2Description: JLCPCB Part URL; ComponentLink2URL: https://jlcpcb.com/partdetail/C326944; ComponentLink3Description: LCSC Part URL; ComponentLink3URL: https://lcsc.com/product-detail/Multilayer-Ceramic-Capacitors-MLCC---SMD-SMT_YAGEO-YAGEO-CC1206JRNPOBBN270_C326944.html
footprint CAP-1206 (1206 (3216M) Capacitor)
pins: 1, 2

## CC1206JRNPOBBN271
designator C?  Capacitance: 270pF  (hidden comment: *)
Capacitor, Ceramic (MLCC), 270pF, ±5%, 500V, NP0, ±5%, SMD 1206; Manufacturer: YAGEO; Manufacturer Part Number: CC1206JRNPOBBN271; Package Size: 1206; JLCPCB Basic Part: No; JLCPCB Part Number: C326654; Supplier 1: LCSC; Category: Capacitors - MLCC; Supplier Part Number 1: C326654; Tolerance: ±5%; Voltage Rating: 500V; Temperature Coefficient: NP0; RoHS: Yes; ComponentLink1Description: Datasheet; ComponentLink1URL: https://wmsc.lcsc.com/wmsc/upload/file/pdf/v2/lcsc/1811151646_YAGEO-CC1206JRNPOBBN271_C326654.pdf; ComponentLink2Description: JLCPCB Part URL; ComponentLink2URL: https://jlcpcb.com/partdetail/C326654; ComponentLink3Description: LCSC Part URL; ComponentLink3URL: https://lcsc.com/product-detail/Multilayer-Ceramic-Capacitors-MLCC---SMD-SMT_YAGEO-YAGEO-CC1206JRNPOBBN271_C326654.html
footprint CAP-1206 (1206 (3216M) Capacitor)
pins: 1, 2

## CC1206JRNPOBBN330
designator C?  Capacitance: 33pF  (hidden comment: *)
Capacitor, Ceramic (MLCC), 33pF, ±5%, 500V, NP0, ±5%, SMD 1206; Manufacturer: YAGEO; Manufacturer Part Number: CC1206JRNPOBBN330; Package Size: 1206; JLCPCB Basic Part: No; JLCPCB Part Number: C577184; Supplier 1: LCSC; Category: Capacitors - MLCC; Supplier Part Number 1: C577184; Tolerance: ±5%; Voltage Rating: 500V; Temperature Coefficient: NP0; RoHS: Yes; ComponentLink1Description: Datasheet; ComponentLink1URL: https://wmsc.lcsc.com/wmsc/upload/file/pdf/v2/lcsc/2304140030_YAGEO-CC1206JRNPOBBN330_C577184.pdf; ComponentLink2Description: JLCPCB Part URL; ComponentLink2URL: https://jlcpcb.com/partdetail/C577184; ComponentLink3Description: LCSC Part URL; ComponentLink3URL: https://lcsc.com/product-detail/Multilayer-Ceramic-Capacitors-MLCC---SMD-SMT_YAGEO-YAGEO-CC1206JRNPOBBN330_C577184.html
footprint CAP-1206 (1206 (3216M) Capacitor)
pins: 1, 2

## CC1206JRNPOBBN331
designator C?  Capacitance: 330pF  (hidden comment: *)
Capacitor, Ceramic (MLCC), 330pF, ±5%, 500V, NP0, ±5%, SMD 1206; Manufacturer: YAGEO; Manufacturer Part Number: CC1206JRNPOBBN331; Package Size: 1206; JLCPCB Basic Part: No; JLCPCB Part Number: C326804; Supplier 1: LCSC; Category: Capacitors - MLCC; Supplier Part Number 1: C326804; Tolerance: ±5%; Voltage Rating: 500V; Temperature Coefficient: NP0; RoHS: Yes; ComponentLink1Description: Datasheet; ComponentLink1URL: https://wmsc.lcsc.com/wmsc/upload/file/pdf/v2/lcsc/1811151646_YAGEO-CC1206JRNPOBBN331_C326804.pdf; ComponentLink2Description: JLCPCB Part URL; ComponentLink2URL: https://jlcpcb.com/partdetail/C326804; ComponentLink3Description: LCSC Part URL; ComponentLink3URL: https://lcsc.com/product-detail/Multilayer-Ceramic-Capacitors-MLCC---SMD-SMT_YAGEO-YAGEO-CC1206JRNPOBBN331_C326804.html
footprint CAP-1206 (1206 (3216M) Capacitor)
pins: 1, 2

## CC1206JRNPOBBN390
designator C?  Capacitance: 39pF  (hidden comment: *)
Capacitor, Ceramic (MLCC), 39pF, ±5%, 500V, NP0, ±5%, SMD 1206; Manufacturer: YAGEO; Manufacturer Part Number: CC1206JRNPOBBN390; Package Size: 1206; JLCPCB Basic Part: No; JLCPCB Part Number: C326958; Supplier 1: LCSC; Category: Capacitors - MLCC; Supplier Part Number 1: C326958; Tolerance: ±5%; Voltage Rating: 500V; Temperature Coefficient: NP0; RoHS: Yes; ComponentLink1Description: Datasheet; ComponentLink1URL: https://wmsc.lcsc.com/wmsc/upload/file/pdf/v2/lcsc/1811141233_YAGEO-CC1206JRNPOBBN390_C326958.pdf; ComponentLink2Description: JLCPCB Part URL; ComponentLink2URL: https://jlcpcb.com/partdetail/C326958; ComponentLink3Description: LCSC Part URL; ComponentLink3URL: https://lcsc.com/product-detail/Multilayer-Ceramic-Capacitors-MLCC---SMD-SMT_YAGEO-YAGEO-CC1206JRNPOBBN390_C326958.html
footprint CAP-1206 (1206 (3216M) Capacitor)
pins: 1, 2

## CC1206JRNPOBBN470
designator C?  Capacitance: 47pF  (hidden comment: *)
Capacitor, Ceramic (MLCC), 47pF, ±5%, 500V, NP0, ±5%, SMD 1206; Manufacturer: YAGEO; Manufacturer Part Number: CC1206JRNPOBBN470; Package Size: 1206; JLCPCB Basic Part: No; JLCPCB Part Number: C113890; Supplier 1: LCSC; Category: Capacitors - MLCC; Supplier Part Number 1: C113890; Tolerance: ±5%; Voltage Rating: 500V; Temperature Coefficient: NP0; RoHS: Yes; ComponentLink1Description: Datasheet; ComponentLink1URL: https://wmsc.lcsc.com/wmsc/upload/file/pdf/v2/lcsc/2304140030_YAGEO-CC1206JRNPOBBN470_C113890.pdf; ComponentLink2Description: JLCPCB Part URL; ComponentLink2URL: https://jlcpcb.com/partdetail/C113890; ComponentLink3Description: LCSC Part URL; ComponentLink3URL: https://lcsc.com/product-detail/Multilayer-Ceramic-Capacitors-MLCC---SMD-SMT_YAGEO-YAGEO-CC1206JRNPOBBN470_C113890.html
footprint CAP-1206 (1206 (3216M) Capacitor)
pins: 1, 2

## CC1206JRNPOBBN471
designator C?  Capacitance: 470pF  (hidden comment: *)
Capacitor, Ceramic (MLCC), 470pF, ±5%, 500V, NP0, ±5%, SMD 1206; Manufacturer: YAGEO; Manufacturer Part Number: CC1206JRNPOBBN471; Package Size: 1206; JLCPCB Basic Part: No; JLCPCB Part Number: C577186; Supplier 1: LCSC; Category: Capacitors - MLCC; Supplier Part Number 1: C577186; Tolerance: ±5%; Voltage Rating: 500V; Temperature Coefficient: NP0; RoHS: Yes; ComponentLink1Description: Datasheet; ComponentLink1URL: https://wmsc.lcsc.com/wmsc/upload/file/pdf/v2/lcsc/2008061233_YAGEO-CC1206JRNPOBBN471_C577186.pdf; ComponentLink2Description: JLCPCB Part URL; ComponentLink2URL: https://jlcpcb.com/partdetail/C577186; ComponentLink3Description: LCSC Part URL; ComponentLink3URL: https://lcsc.com/product-detail/Multilayer-Ceramic-Capacitors-MLCC---SMD-SMT_YAGEO-YAGEO-CC1206JRNPOBBN471_C577186.html
footprint CAP-1206 (1206 (3216M) Capacitor)
pins: 1, 2

## CC1206JRNPOBBN561
designator C?  Capacitance: 560pF  (hidden comment: *)
Capacitor, Ceramic (MLCC), 560pF, ±5%, 500V, NP0, ±5%, SMD 1206; Manufacturer: YAGEO; Manufacturer Part Number: CC1206JRNPOBBN561; Package Size: 1206; JLCPCB Basic Part: No; JLCPCB Part Number: C527308; Supplier 1: LCSC; Category: Capacitors - MLCC; Supplier Part Number 1: C527308; Tolerance: ±5%; Voltage Rating: 500V; Temperature Coefficient: NP0; RoHS: Yes; ComponentLink1Description: Datasheet; ComponentLink1URL: https://wmsc.lcsc.com/wmsc/upload/file/pdf/v2/lcsc/2007021837_YAGEO-CC1206JRNPOBBN561_C527308.pdf; ComponentLink2Description: JLCPCB Part URL; ComponentLink2URL: https://jlcpcb.com/partdetail/C527308; ComponentLink3Description: LCSC Part URL; ComponentLink3URL: https://lcsc.com/product-detail/Multilayer-Ceramic-Capacitors-MLCC---SMD-SMT_YAGEO-YAGEO-CC1206JRNPOBBN561_C527308.html
footprint CAP-1206 (1206 (3216M) Capacitor)
pins: 1, 2

## CC1206JRNPOBBN680
designator C?  Capacitance: 68pF  (hidden comment: *)
Capacitor, Ceramic (MLCC), 68pF, ±5%, 500V, NP0, ±5%, SMD 1206; Manufacturer: YAGEO; Manufacturer Part Number: CC1206JRNPOBBN680; Package Size: 1206; JLCPCB Basic Part: No; JLCPCB Part Number: C326652; Supplier 1: LCSC; Category: Capacitors - MLCC; Supplier Part Number 1: C326652; Tolerance: ±5%; Voltage Rating: 500V; Temperature Coefficient: NP0; RoHS: Yes; ComponentLink1Description: Datasheet; ComponentLink1URL: https://wmsc.lcsc.com/wmsc/upload/file/pdf/v2/lcsc/1811061214_YAGEO-CC1206JRNPOBBN680_C326652.pdf; ComponentLink2Description: JLCPCB Part URL; ComponentLink2URL: https://jlcpcb.com/partdetail/C326652; ComponentLink3Description: LCSC Part URL; ComponentLink3URL: https://lcsc.com/product-detail/Multilayer-Ceramic-Capacitors-MLCC---SMD-SMT_YAGEO-YAGEO-CC1206JRNPOBBN680_C326652.html
footprint CAP-1206 (1206 (3216M) Capacitor)
pins: 1, 2